# Altium schematic symbol library jlcpcb_2025_04_capacitors_extended_0603.schlib: 3668 symbols (part 16 of 20) (continued)
## GQM1875C2E390JB12D (continued)

## GQM1875C2E470JB12D
designator C?  Capacitance: 47pF  (hidden comment: *)
Capacitor, Ceramic (MLCC), 47pF, ±5%, 250V, null, ±5%, SMD 0603; Manufacturer: Murata Electronics; Manufacturer Part Number: GQM1875C2E470JB12D; Package Size: 0603; JLCPCB Basic Part: No; JLCPCB Part Number: C882552; Supplier 1: LCSC; Category: Capacitors - MLCC; Supplier Part Number 1: C882552; Tolerance: ±5%; Voltage Rating: 250V; Temperature Coefficient: null; RoHS: Yes; ComponentLink1Description: Datasheet; ComponentLink1URL: https://wmsc.lcsc.com/wmsc/upload/file/pdf/v2/lcsc/2201242130_Murata-Electronics-GQM1875C2E470JB12D_C882552.pdf; ComponentLink2Description: JLCPCB Part URL; ComponentLink2URL: https://jlcpcb.com/partdetail/C882552; ComponentLink3Description: LCSC Part URL; ComponentLink3URL: https://lcsc.com/product-detail/Multilayer-Ceramic-Capacitors-MLCC---SMD-SMT_Murata-Electronics-Murata-Electronics-GQM1875C2E470JB12D_C882552.html
footprint CAP-0603 (0603 (1608M) Capacitor)
pins: 1, 2

## GQM1875C2E560JB12D
designator C?  Capacitance: 56pF  (hidden comment: *)
Capacitor, Ceramic (MLCC), 56pF, ±5%, 250V, C0G, ±5%, SMD 0603; Manufacturer: Murata Electronics; Manufacturer Part Number: GQM1875C2E560JB12D; Package Size: 0603; JLCPCB Basic Part: No; JLCPCB Part Number: C237591; Supplier 1: LCSC; Category: Capacitors - MLCC; Supplier Part Number 1: C237591; Tolerance: ±5%; Voltage Rating: 250V; Temperature Coefficient: C0G; RoHS: Yes; ComponentLink1Description: Datasheet; ComponentLink1URL: https://wmsc.lcsc.com/wmsc/upload/file/pdf/v2/lcsc/2109101130_Murata-Electronics-GQM1875C2E560JB12D_C237591.pdf; ComponentLink2Description: JLCPCB Part URL; ComponentLink2URL: https://jlcpcb.com/partdetail/C237591; ComponentLink3Description: LCSC Part URL; ComponentLink3URL: https://lcsc.com/product-detail/Multilayer-Ceramic-Capacitors-MLCC---SMD-SMT_Murata-Electronics-Murata-Electronics-GQM1875C2E560JB12D_C237591.html
footprint CAP-0603 (0603 (1608M) Capacitor)
pins: 1, 2

## GQM1875C2ER50BB12D
designator C?  Capacitance: 0.5pF  (hidden comment: *)
Capacitor, Ceramic (MLCC), 0.5pF, 250V, null, SMD 0603; Manufacturer: Murata Electronics; Manufacturer Part Number: GQM1875C2ER50BB12D; Package Size: 0603; JLCPCB Basic Part: No; JLCPCB Part Number: C2178749; Supplier 1: LCSC; Category: Capacitors - MLCC; Supplier Part Number 1: C2178749; Voltage Rating: 250V; Temperature Coefficient: null; RoHS: Yes; ComponentLink1Description: Datasheet; ComponentLink1URL: https://wmsc.lcsc.com/wmsc/upload/file/pdf/v2/lcsc/2202041000_Murata-Electronics-GQM1875C2ER50BB12D_C2178749.pdf; ComponentLink2Description: JLCPCB Part URL; ComponentLink2URL: https://jlcpcb.com/partdetail/C2178749; ComponentLink3Description: LCSC Part URL; ComponentLink3URL: https://lcsc.com/product-detail/Multilayer-Ceramic-Capacitors-MLCC---SMD-SMT_Murata-Electronics-Murata-Electronics-GQM1875C2ER50BB12D_C2178749.html
footprint CAP-0603 (0603 (1608M) Capacitor)
pins: 1, 2

## GQM1885C1H8R0CB01D
designator C?  Capacitance: 8pF  (hidden comment: *)
Capacitor, Ceramic (MLCC), 8pF, 50V, C0G, SMD 0603; Manufacturer: Murata Electronics; Manufacturer Part Number: GQM1885C1H8R0CB01D; Package Size: 0603; JLCPCB Basic Part: No; JLCPCB Part Number: C415517; Supplier 1: LCSC; Category: Capacitors - MLCC; Supplier Part Number 1: C415517; Voltage Rating: 50V; Temperature Coefficient: C0G; RoHS: Yes; ComponentLink1Description: Datasheet; ComponentLink1URL: https://wmsc.lcsc.com/wmsc/upload/file/pdf/v2/lcsc/2304140030_Murata-Electronics-GQM1885C1H8R0CB01D_C415517.pdf; ComponentLink2Description: JLCPCB Part URL; ComponentLink2URL: https://jlcpcb.com/partdetail/C415517; ComponentLink3Description: LCSC Part URL; ComponentLink3URL: https://lcsc.com/product-detail/Multilayer-Ceramic-Capacitors-MLCC---SMD-SMT_Murata-Electronics-Murata-Electronics-GQM1885C1H8R0CB01D_C415517.html
footprint CAP-0603 (0603 (1608M) Capacitor)
pins: 1, 2

## GRJ188C70J475KE11D
designator C?  Capacitance: 4.7uF  (hidden comment: *)
Capacitor, Ceramic (MLCC), 4.7uF, ±10%, 6.3V, X7S, ±10%, SMD 0603; Manufacturer: Murata Electronics; Manufacturer Part Number: GRJ188C70J475KE11D; Package Size: 0603; JLCPCB Basic Part: No; JLCPCB Part Number: C2177379; Supplier 1: LCSC; Category: Capacitors - MLCC; Supplier Part Number 1: C2177379; Tolerance: ±10%; Voltage Rating: 6.3V; Temperature Coefficient: X7S; RoHS: Yes; ComponentLink1Description: Datasheet; ComponentLink1URL: https://wmsc.lcsc.com/wmsc/upload/file/pdf/v2/lcsc/2308111627_Murata-Electronics-GRJ188C70J475KE11D_C2177379.pdf; ComponentLink2Description: JLCPCB Part URL; ComponentLink2URL: https://jlcpcb.com/partdetail/C2177379; ComponentLink3Description: LCSC Part URL; ComponentLink3URL: https://lcsc.com/product-detail/Multilayer-Ceramic-Capacitors-MLCC---SMD-SMT_Murata-Electronics-Murata-Electronics-GRJ188C70J475KE11D_C2177379.html
footprint CAP-0603 (0603 (1608M) Capacitor)
pins: 1, 2

## GRJ188R72A104KE11D
designator C?  Capacitance: 0.1uF  (hidden comment: *)
Capacitor, Ceramic (MLCC), 0.1uF, ±10%, 100V, X7R, ±10%, SMD 0603; Manufacturer: Murata Electronics; Manufacturer Part Number: GRJ188R72A104KE11D; Package Size: 0603; JLCPCB Basic Part: No; JLCPCB Part Number: C710755; Supplier 1: LCSC; Category: Capacitors - MLCC; Supplier Part Number 1: C710755; Tolerance: ±10%; Voltage Rating: 100V; Temperature Coefficient: X7R; RoHS: Yes; ComponentLink1Description: Datasheet; ComponentLink1URL: https://wmsc.lcsc.com/wmsc/upload/file/pdf/v2/lcsc/2308111627_Murata-Electronics-GRJ188R72A104KE11D_C710755.pdf; ComponentLink2Description: JLCPCB Part URL; ComponentLink2URL: https://jlcpcb.com/partdetail/C710755; ComponentLink3Description: LCSC Part URL; ComponentLink3URL: https://lcsc.com/product-detail/Multilayer-Ceramic-Capacitors-MLCC---SMD-SMT_Murata-Electronics-Murata-Electronics-GRJ188R72A104KE11D_C710755.html
footprint CAP-0603 (0603 (1608M) Capacitor)
pins: 1, 2

## GRM185C81A475KE11D
designator C?  Capacitance: 4.7uF  (hidden comment: *)
Capacitor, Ceramic (MLCC), 4.7uF, ±10%, 10V, X6S, ±10%, SMD 0603; Manufacturer: Murata Electronics; Manufacturer Part Number: GRM185C81A475KE11D; Package Size: 0603; JLCPCB Basic Part: No; JLCPCB Part Number: C2170994; Supplier 1: LCSC; Category: Capacitors - MLCC; Supplier Part Number 1: C2170994; Tolerance: ±10%; Voltage Rating: 10V; Temperature Coefficient: X6S; RoHS: Yes; ComponentLink1Description: Datasheet; ComponentLink1URL: https://wmsc.lcsc.com/wmsc/upload/file/pdf/v2/lcsc/2202040500_Murata-Electronics-GRM185C81A475KE11D_C2170994.pdf; ComponentLink2Description: JLCPCB Part URL; ComponentLink2URL: https://jlcpcb.com/partdetail/C2170994; ComponentLink3Description: LCSC Part URL; ComponentLink3URL: https://lcsc.com/product-detail/Multilayer-Ceramic-Capacitors-MLCC---SMD-SMT_Murata-Electronics-Murata-Electronics-GRM185C81A475KE11D_C2170994.html
footprint CAP-0603 (0603 (1608M) Capacitor)
pins: 1, 2

## GRM185R60G106ME15D
designator C?  Capacitance: 10uF  (hidden comment: *)
Capacitor, Ceramic (MLCC), 10uF, ±20%, 4V, X5R, ±20%, SMD 0603; Manufacturer: Murata Electronics; Manufacturer Part Number: GRM185R60G106ME15D; Package Size: 0603; JLCPCB Basic Part: No; JLCPCB Part Number: C909848; Supplier 1: LCSC; Category: Capacitors - MLCC; Supplier Part Number 1: C909848; Tolerance: ±20%; Voltage Rating: 4V; Temperature Coefficient: X5R; RoHS: Yes; ComponentLink1Description: Datasheet; ComponentLink1URL: https://wmsc.lcsc.com/wmsc/upload/file/pdf/v2/lcsc/2304140030_Murata-Electronics-GRM185R60G106ME15D_C909848.pdf; ComponentLink2Description: JLCPCB Part URL; ComponentLink2URL: https://jlcpcb.com/partdetail/C909848; ComponentLink3Description: LCSC Part URL; ComponentLink3URL: https://lcsc.com/product-detail/Multilayer-Ceramic-Capacitors-MLCC---SMD-SMT_Murata-Electronics-Murata-Electronics-GRM185R60G106ME15D_C909848.html
footprint CAP-0603 (0603 (1608M) Capacitor)
pins: 1, 2

## GRM185R60J225KE26D
designator C?  Capacitance: 2.2uF  (hidden comment: *)
Capacitor, Ceramic (MLCC), 2.2uF, ±10%, 6.3V, X5R, ±10%, SMD 0603; Manufacturer: Murata Electronics; Manufacturer Part Number: GRM185R60J225KE26D; Package Size: 0603; JLCPCB Basic Part: No; JLCPCB Part Number: C440177; Supplier 1: LCSC; Category: Capacitors - MLCC; Supplier Part Number 1: C440177; Tolerance: ±10%; Voltage Rating: 6.3V; Temperature Coefficient: X5R; RoHS: Yes; ComponentLink1Description: Datasheet; ComponentLink1URL: https://wmsc.lcsc.com/wmsc/upload/file/pdf/v2/lcsc/2304140030_Murata-Electronics-GRM185R60J225KE26D_C440177.pdf; ComponentLink2Description: JLCPCB Part URL; ComponentLink2URL: https://jlcpcb.com/partdetail/C440177; ComponentLink3Description: LCSC Part URL; ComponentLink3URL: https://lcsc.com/product-detail/Multilayer-Ceramic-Capacitors-MLCC---SMD-SMT_Murata-Electronics-Murata-Electronics-GRM185R60J225KE26D_C440177.html
footprint CAP-0603 (0603 (1608M) Capacitor)
pins: 1, 2

## GRM185R61A225KE43D
designator C?  Capacitance: 2.2uF  (hidden comment: *)
Capacitor, Ceramic (MLCC), 2.2uF, ±10%, 10V, X5R, ±10%, SMD 0603; Manufacturer: Murata Electronics; Manufacturer Part Number: GRM185R61A225KE43D; Package Size: 0603; JLCPCB Basic Part: No; JLCPCB Part Number: C408133; Supplier 1: LCSC; Category: Capacitors - MLCC; Supplier Part Number 1: C408133; Tolerance: ±10%; Voltage Rating: 10V; Temperature Coefficient: X5R; RoHS: Yes; ComponentLink1Description: Datasheet; ComponentLink1URL: https://wmsc.lcsc.com/wmsc/upload/file/pdf/v2/lcsc/2304140030_Murata-Electronics-GRM185R61A225KE43D_C408133.pdf; ComponentLink2Description: JLCPCB Part URL; ComponentLink2URL: https://jlcpcb.com/partdetail/C408133; ComponentLink3Description: LCSC Part URL; ComponentLink3URL: https://lcsc.com/product-detail/Multilayer-Ceramic-Capacitors-MLCC---SMD-SMT_Murata-Electronics-Murata-Electronics-GRM185R61A225KE43D_C408133.html
footprint CAP-0603 (0603 (1608M) Capacitor)
pins: 1, 2

## GRM185R61C475KE11D
designator C?  Capacitance: 4.7uF  (hidden comment: *)
Capacitor, Ceramic (MLCC), 4.7uF, ±10%, 16V, X5R, ±10%, SMD 0603; Manufacturer: Murata Electronics; Manufacturer Part Number: GRM185R61C475KE11D; Package Size: 0603; JLCPCB Basic Part: No; JLCPCB Part Number: C361060; Supplier 1: LCSC; Category: Capacitors - MLCC; Supplier Part Number 1: C361060; Tolerance: ±10%; Voltage Rating: 16V; Temperature Coefficient: X5R; RoHS: Yes; ComponentLink1Description: Datasheet; ComponentLink1URL: https://wmsc.lcsc.com/wmsc/upload/file/pdf/v2/lcsc/2206171701_Murata-Electronics-GRM185R61C475KE11D_C361060.pdf; ComponentLink2Description: JLCPCB Part URL; ComponentLink2URL: https://jlcpcb.com/partdetail/C361060; ComponentLink3Description: LCSC Part URL; ComponentLink3URL: https://lcsc.com/product-detail/Multilayer-Ceramic-Capacitors-MLCC---SMD-SMT_Murata-Electronics-Murata-Electronics-GRM185R61C475KE11D_C361060.html
footprint CAP-0603 (0603 (1608M) Capacitor)
pins: 1, 2

## GRM186R60J226ME15D
designator C?  Capacitance: 22uF  (hidden comment: *)
Capacitor, Ceramic (MLCC), 22uF, ±20%, 6.3V, X5R, ±20%, SMD 0603; Manufacturer: Murata Electronics; Manufacturer Part Number: GRM186R60J226ME15D; Package Size: 0603; JLCPCB Basic Part: No; JLCPCB Part Number: C237460; Supplier 1: LCSC; Category: Capacitors - MLCC; Supplier Part Number 1: C237460; Tolerance: ±20%; Voltage Rating: 6.3V; Temperature Coefficient: X5R; RoHS: Yes; ComponentLink1Description: Datasheet; ComponentLink1URL: https://wmsc.lcsc.com/wmsc/upload/file/pdf/v2/lcsc/1912111437_Murata-Electronics-GRM186R60J226ME15D_C237460.pdf; ComponentLink2Description: JLCPCB Part URL; ComponentLink2URL: https://jlcpcb.com/partdetail/C237460; ComponentLink3Description: LCSC Part URL; ComponentLink3URL: https://lcsc.com/product-detail/Multilayer-Ceramic-Capacitors-MLCC---SMD-SMT_Murata-Electronics-Murata-Electronics-GRM186R60J226ME15D_C237460.html
footprint CAP-0603 (0603 (1608M) Capacitor)
pins: 1, 2

## GRM187R60J226ME15D
designator C?  Capacitance: 22uF  (hidden comment: *)
Capacitor, Ceramic (MLCC), 22uF, ±20%, 6.3V, X5R, ±20%, SMD 0603; Manufacturer: Murata Electronics; Manufacturer Part Number: GRM187R60J226ME15D; Package Size: 0603; JLCPCB Basic Part: No; JLCPCB Part Number: C710887; Supplier 1: LCSC; Category: Capacitors - MLCC; Supplier Part Number 1: C710887; Tolerance: ±20%; Voltage Rating: 6.3V; Temperature Coefficient: X5R; RoHS: Yes; ComponentLink1Description: Datasheet; ComponentLink1URL: https://wmsc.lcsc.com/wmsc/upload/file/pdf/v2/lcsc/2210190600_Murata-Electronics-GRM187R60J226ME15D_C710887.pdf; ComponentLink2Description: JLCPCB Part URL; ComponentLink2URL: https://jlcpcb.com/partdetail/C710887; ComponentLink3Description: LCSC Part URL; ComponentLink3URL: https://lcsc.com/product-detail/Multilayer-Ceramic-Capacitors-MLCC---SMD-SMT_Murata-Electronics-Murata-Electronics-GRM187R60J226ME15D_C710887.html
footprint CAP-0603 (0603 (1608M) Capacitor)
pins: 1, 2

## GRM187R61A226ME15D
designator C?  Capacitance: 22uF  (hidden comment: *)
Capacitor, Ceramic (MLCC), 22uF, ±20%, 10V, X5R, ±20%, SMD 0603; Manufacturer: Murata Electronics; Manufacturer Part Number: GRM187R61A226ME15D; Package Size: 0603; JLCPCB Basic Part: No; JLCPCB Part Number: C361061; Supplier 1: LCSC; Category: Capacitors - MLCC; Supplier Part Number 1: C361061; Tolerance: ±20%; Voltage Rating: 10V; Temperature Coefficient: X5R; RoHS: Yes; ComponentLink1Description: Datasheet; ComponentLink1URL: https://wmsc.lcsc.com/wmsc/upload/file/pdf/v2/lcsc/2308111554_Murata-Electronics-GRM187R61A226ME15D_C361061.pdf; ComponentLink2Description: JLCPCB Part URL; ComponentLink2URL: https://jlcpcb.com/partdetail/C361061; ComponentLink3Description: LCSC Part URL; ComponentLink3URL: https://lcsc.com/product-detail/Multilayer-Ceramic-Capacitors-MLCC---SMD-SMT_Murata-Electronics-Murata-Electronics-GRM187R61A226ME15D_C361061.html
footprint CAP-0603 (0603 (1608M) Capacitor)
pins: 1, 2

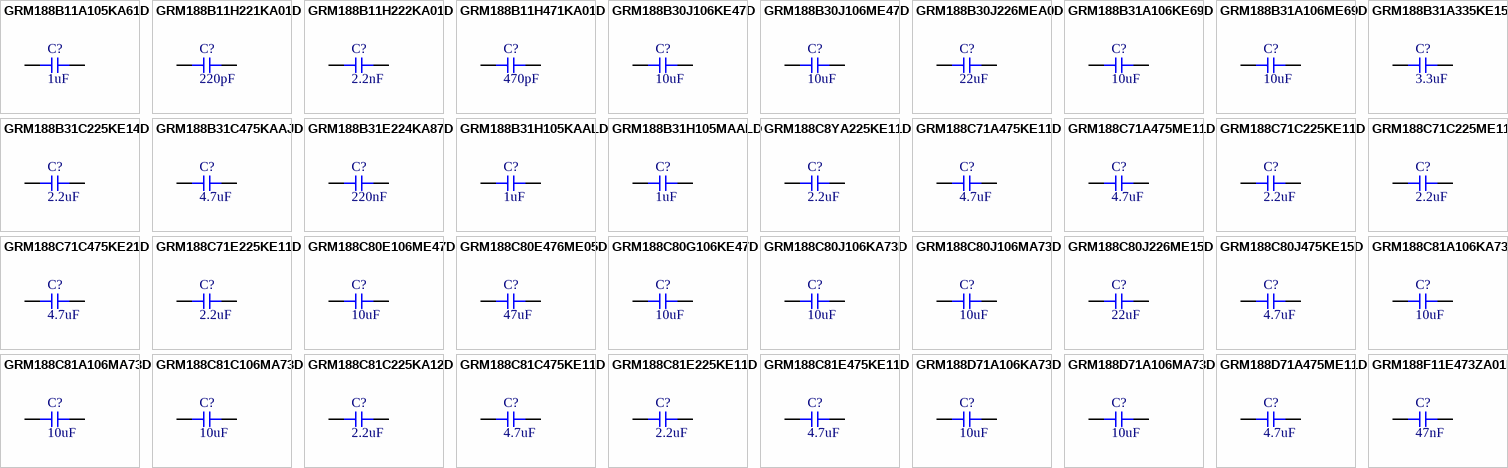
[diagram p72: symbols GRM188B11A105KA61D to GRM188F11E473ZA01D]

## GRM188B11A105KA61D
designator C?  Capacitance: 1uF  (hidden comment: *)
Capacitor, Ceramic (MLCC), 1uF, ±10%, 10V, B, ±10%, SMD 0603; Manufacturer: Murata Electronics; Manufacturer Part Number: GRM188B11A105KA61D; Package Size: 0603; JLCPCB Basic Part: No; JLCPCB Part Number: C162264; Supplier 1: LCSC; Category: Capacitors - MLCC; Supplier Part Number 1: C162264; Tolerance: ±10%; Voltage Rating: 10V; Temperature Coefficient: B; RoHS: Yes; ComponentLink1Description: Datasheet; ComponentLink1URL: https://wmsc.lcsc.com/wmsc/upload/file/pdf/v2/lcsc/1912111437_Murata-Electronics-GRM188B11A105KA61D_C162264.pdf; ComponentLink2Description: JLCPCB Part URL; ComponentLink2URL: https://jlcpcb.com/partdetail/C162264; ComponentLink3Description: LCSC Part URL; ComponentLink3URL: https://lcsc.com/product-detail/Multilayer-Ceramic-Capacitors-MLCC---SMD-SMT_Murata-Electronics-Murata-Electronics-GRM188B11A105KA61D_C162264.html
footprint CAP-0603 (0603 (1608M) Capacitor)
pins: 1, 2

## GRM188B11H221KA01D
designator C?  Capacitance: 220pF  (hidden comment: *)
Capacitor, Ceramic (MLCC), 220pF, ±10%, ±10%, SMD 0603; Manufacturer: Murata Electronics; Manufacturer Part Number: GRM188B11H221KA01D; Package Size: 0603; JLCPCB Basic Part: No; JLCPCB Part Number: C783269; Supplier 1: LCSC; Category: Capacitors - MLCC; Supplier Part Number 1: C783269; Tolerance: ±10%; RoHS: Yes; ComponentLink1Description: Datasheet; ComponentLink1URL: https://wmsc.lcsc.com/wmsc/upload/file/pdf/v2/lcsc/2304140030_Murata-Electronics-GRM188B11H221KA01D_C783269.pdf; ComponentLink2Description: JLCPCB Part URL; ComponentLink2URL: https://jlcpcb.com/partdetail/C783269; ComponentLink3Description: LCSC Part URL; ComponentLink3URL: https://lcsc.com/product-detail/Multilayer-Ceramic-Capacitors-MLCC---SMD-SMT_Murata-Electronics-Murata-Electronics-GRM188B11H221KA01D_C783269.html
footprint CAP-0603 (0603 (1608M) Capacitor)
pins: 1, 2

## GRM188B11H222KA01D
designator C?  Capacitance: 2.2nF  (hidden comment: *)
Capacitor, Ceramic (MLCC), 2.2nF, ±10%, 50V, C0G, ±10%, SMD 0603; Manufacturer: Murata Electronics; Manufacturer Part Number: GRM188B11H222KA01D; Package Size: 0603; JLCPCB Basic Part: No; JLCPCB Part Number: C415545; Supplier 1: LCSC; Category: Capacitors - MLCC; Supplier Part Number 1: C415545; Tolerance: ±10%; Voltage Rating: 50V; Temperature Coefficient: C0G; RoHS: Yes; ComponentLink1Description: Datasheet; ComponentLink1URL: https://wmsc.lcsc.com/wmsc/upload/file/pdf/v2/lcsc/2304140030_Murata-Electronics-GRM188B11H222KA01D_C415545.pdf; ComponentLink2Description: JLCPCB Part URL; ComponentLink2URL: https://jlcpcb.com/partdetail/C415545; ComponentLink3Description: LCSC Part URL; ComponentLink3URL: https://lcsc.com/product-detail/Multilayer-Ceramic-Capacitors-MLCC---SMD-SMT_Murata-Electronics-Murata-Electronics-GRM188B11H222KA01D_C415545.html
footprint CAP-0603 (0603 (1608M) Capacitor)
pins: 1, 2

## GRM188B11H471KA01D
designator C?  Capacitance: 470pF  (hidden comment: *)
Capacitor, Ceramic (MLCC), 470pF, ±10%, 50V, B, ±10%, SMD 0603; Manufacturer: Murata Electronics; Manufacturer Part Number: GRM188B11H471KA01D; Package Size: 0603; JLCPCB Basic Part: No; JLCPCB Part Number: C521248; Supplier 1: LCSC; Category: Capacitors - MLCC; Supplier Part Number 1: C521248; Tolerance: ±10%; Voltage Rating: 50V; Temperature Coefficient: B; RoHS: Yes; ComponentLink1Description: Datasheet; ComponentLink1URL: https://wmsc.lcsc.com/wmsc/upload/file/pdf/v2/lcsc/2005071506_Murata-Electronics-GRM188B11H471KA01D_C521248.pdf; ComponentLink2Description: JLCPCB Part URL; ComponentLink2URL: https://jlcpcb.com/partdetail/C521248; ComponentLink3Description: LCSC Part URL; ComponentLink3URL: https://lcsc.com/product-detail/Multilayer-Ceramic-Capacitors-MLCC---SMD-SMT_Murata-Electronics-Murata-Electronics-GRM188B11H471KA01D_C521248.html
footprint CAP-0603 (0603 (1608M) Capacitor)
pins: 1, 2

## GRM188B30J106KE47D
designator C?  Capacitance: 10uF  (hidden comment: *)
Capacitor, Ceramic (MLCC), 10uF, ±10%, 6.3V, B, ±10%, SMD 0603; Manufacturer: Murata Electronics; Manufacturer Part Number: GRM188B30J106KE47D; Package Size: 0603; JLCPCB Basic Part: No; JLCPCB Part Number: C393030; Supplier 1: LCSC; Category: Capacitors - MLCC; Supplier Part Number 1: C393030; Tolerance: ±10%; Voltage Rating: 6.3V; Temperature Coefficient: B; RoHS: Yes; ComponentLink1Description: Datasheet; ComponentLink1URL: https://wmsc.lcsc.com/wmsc/upload/file/pdf/v2/lcsc/1912111437_Murata-Electronics-GRM188B30J106KE47D_C393030.pdf; ComponentLink2Description: JLCPCB Part URL; ComponentLink2URL: https://jlcpcb.com/partdetail/C393030; ComponentLink3Description: LCSC Part URL; ComponentLink3URL: https://lcsc.com/product-detail/Multilayer-Ceramic-Capacitors-MLCC---SMD-SMT_Murata-Electronics-Murata-Electronics-GRM188B30J106KE47D_C393030.html
footprint CAP-0603 (0603 (1608M) Capacitor)
pins: 1, 2

## GRM188B30J106ME47D
designator C?  Capacitance: 10uF  (hidden comment: *)
Capacitor, Ceramic (MLCC), 10uF, ±20%, 6.3V, B, ±20%, SMD 0603; Manufacturer: Murata Electronics; Manufacturer Part Number: GRM188B30J106ME47D; Package Size: 0603; JLCPCB Basic Part: No; JLCPCB Part Number: C15499; Supplier 1: LCSC; Category: Capacitors - MLCC; Supplier Part Number 1: C15499; Tolerance: ±20%; Voltage Rating: 6.3V; Temperature Coefficient: B; RoHS: Yes; ComponentLink1Description: Datasheet; ComponentLink1URL: https://wmsc.lcsc.com/wmsc/upload/file/pdf/v2/lcsc/1810311111_Murata-Electronics-GRM188B30J106ME47D_C15499.pdf; ComponentLink2Description: JLCPCB Part URL; ComponentLink2URL: https://jlcpcb.com/partdetail/C15499; ComponentLink3Description: LCSC Part URL; ComponentLink3URL: https://lcsc.com/product-detail/Multilayer-Ceramic-Capacitors-MLCC---SMD-SMT_Murata-Electronics-Murata-Electronics-GRM188B30J106ME47D_C15499.html
footprint CAP-0603 (0603 (1608M) Capacitor)
pins: 1, 2

## GRM188B30J226MEA0D
designator C?  Capacitance: 22uF  (hidden comment: *)
Capacitor, Ceramic (MLCC), 22uF, ±20%, 6.3V, B, ±20%, SMD 0603; Manufacturer: Murata Electronics; Manufacturer Part Number: GRM188B30J226MEA0D; Package Size: 0603; JLCPCB Basic Part: No; JLCPCB Part Number: C15500; Supplier 1: LCSC; Category: Capacitors - MLCC; Supplier Part Number 1: C15500; Tolerance: ±20%; Voltage Rating: 6.3V; Temperature Coefficient: B; RoHS: Yes; ComponentLink1Description: Datasheet; ComponentLink1URL: https://wmsc.lcsc.com/wmsc/upload/file/pdf/v2/lcsc/1810311110_Murata-Electronics-GRM188B30J226MEA0D_C15500.pdf; ComponentLink2Description: JLCPCB Part URL; ComponentLink2URL: https://jlcpcb.com/partdetail/C15500; ComponentLink3Description: LCSC Part URL; ComponentLink3URL: https://lcsc.com/product-detail/Multilayer-Ceramic-Capacitors-MLCC---SMD-SMT_Murata-Electronics-Murata-Electronics-GRM188B30J226MEA0D_C15500.html
footprint CAP-0603 (0603 (1608M) Capacitor)
pins: 1, 2

## GRM188B31A106KE69D
designator C?  Capacitance: 10uF  (hidden comment: *)
Capacitor, Ceramic (MLCC), 10uF, ±10%, 10V, B, ±10%, SMD 0603; Manufacturer: Murata Electronics; Manufacturer Part Number: GRM188B31A106KE69D; Package Size: 0603; JLCPCB Basic Part: No; JLCPCB Part Number: C469532; Supplier 1: LCSC; Category: Capacitors - MLCC; Supplier Part Number 1: C469532; Tolerance: ±10%; Voltage Rating: 10V; Temperature Coefficient: B; RoHS: Yes; ComponentLink1Description: Datasheet; ComponentLink1URL: https://wmsc.lcsc.com/wmsc/upload/file/pdf/v2/lcsc/2001091507_Murata-Electronics-GRM188B31A106KE69D_C469532.pdf; ComponentLink2Description: JLCPCB Part URL; ComponentLink2URL: https://jlcpcb.com/partdetail/C469532; ComponentLink3Description: LCSC Part URL; ComponentLink3URL: https://lcsc.com/product-detail/Multilayer-Ceramic-Capacitors-MLCC---SMD-SMT_Murata-Electronics-Murata-Electronics-GRM188B31A106KE69D_C469532.html
footprint CAP-0603 (0603 (1608M) Capacitor)
pins: 1, 2

## GRM188B31A106ME69D
designator C?  Capacitance: 10uF  (hidden comment: *)
Capacitor, Ceramic (MLCC), 10uF, ±20%, 10V, B, ±20%, SMD 0603; Manufacturer: Murata Electronics; Manufacturer Part Number: GRM188B31A106ME69D; Package Size: 0603; JLCPCB Basic Part: No; JLCPCB Part Number: C162265; Supplier 1: LCSC; Category: Capacitors - MLCC; Supplier Part Number 1: C162265; Tolerance: ±20%; Voltage Rating: 10V; Temperature Coefficient: B; RoHS: Yes; ComponentLink1Description: Datasheet; ComponentLink1URL: https://wmsc.lcsc.com/wmsc/upload/file/pdf/v2/lcsc/1810311134_Murata-Electronics-GRM188B31A106ME69D_C162265.pdf; ComponentLink2Description: JLCPCB Part URL; ComponentLink2URL: https://jlcpcb.com/partdetail/C162265; ComponentLink3Description: LCSC Part URL; ComponentLink3URL: https://lcsc.com/product-detail/Multilayer-Ceramic-Capacitors-MLCC---SMD-SMT_Murata-Electronics-Murata-Electronics-GRM188B31A106ME69D_C162265.html
footprint CAP-0603 (0603 (1608M) Capacitor)
pins: 1, 2

## GRM188B31A335KE15D
designator C?  Capacitance: 3.3uF  (hidden comment: *)
Capacitor, Ceramic (MLCC), 3.3uF, ±10%, 10V, B, ±10%, SMD 0603; Manufacturer: Murata Electronics; Manufacturer Part Number: GRM188B31A335KE15D; Package Size: 0603; JLCPCB Basic Part: No; JLCPCB Part Number: C528975; Supplier 1: LCSC; Category: Capacitors - MLCC; Supplier Part Number 1: C528975; Tolerance: ±10%; Voltage Rating: 10V; Temperature Coefficient: B; RoHS: Yes; ComponentLink1Description: Datasheet; ComponentLink1URL: https://wmsc.lcsc.com/wmsc/upload/file/pdf/v2/lcsc/2005141808_Murata-Electronics-GRM188B31A335KE15D_C528975.pdf; ComponentLink2Description: JLCPCB Part URL; ComponentLink2URL: https://jlcpcb.com/partdetail/C528975; ComponentLink3Description: LCSC Part URL; ComponentLink3URL: https://lcsc.com/product-detail/Multilayer-Ceramic-Capacitors-MLCC---SMD-SMT_Murata-Electronics-Murata-Electronics-GRM188B31A335KE15D_C528975.html
footprint CAP-0603 (0603 (1608M) Capacitor)
pins: 1, 2

## GRM188B31C225KE14D
designator C?  Capacitance: 2.2uF  (hidden comment: *)
Capacitor, Ceramic (MLCC), 2.2uF, ±10%, ±10%, SMD 0603; Manufacturer: Murata Electronics; Manufacturer Part Number: GRM188B31C225KE14D; Package Size: 0603; JLCPCB Basic Part: No; JLCPCB Part Number: C913643; Supplier 1: LCSC; Category: Capacitors - MLCC; Supplier Part Number 1: C913643; Tolerance: ±10%; RoHS: Yes; ComponentLink1Description: Datasheet; ComponentLink1URL: https://wmsc.lcsc.com/wmsc/upload/file/pdf/v2/lcsc/2201131300_Murata-Electronics-GRM188B31C225KE14D_C913643.pdf; ComponentLink2Description: JLCPCB Part URL; ComponentLink2URL: https://jlcpcb.com/partdetail/C913643; ComponentLink3Description: LCSC Part URL; ComponentLink3URL: https://lcsc.com/product-detail/Multilayer-Ceramic-Capacitors-MLCC---SMD-SMT_Murata-Electronics-Murata-Electronics-GRM188B31C225KE14D_C913643.html
footprint CAP-0603 (0603 (1608M) Capacitor)
pins: 1, 2

## GRM188B31C475KAAJD
designator C?  Capacitance: 4.7uF  (hidden comment: *)
Capacitor, Ceramic (MLCC), 4.7uF, ±10%, 16V, B, ±10%, SMD 0603; Manufacturer: Murata Electronics; Manufacturer Part Number: GRM188B31C475KAAJD; Package Size: 0603; JLCPCB Basic Part: No; JLCPCB Part Number: C162266; Supplier 1: LCSC; Category: Capacitors - MLCC; Supplier Part Number 1: C162266; Tolerance: ±10%; Voltage Rating: 16V; Temperature Coefficient: B; RoHS: Yes; ComponentLink1Description: Datasheet; ComponentLink1URL: https://wmsc.lcsc.com/wmsc/upload/file/pdf/v2/lcsc/2304140030_Murata-Electronics-GRM188B31C475KAAJD_C162266.pdf; ComponentLink2Description: JLCPCB Part URL; ComponentLink2URL: https://jlcpcb.com/partdetail/C162266; ComponentLink3Description: LCSC Part URL; ComponentLink3URL: https://lcsc.com/product-detail/Multilayer-Ceramic-Capacitors-MLCC---SMD-SMT_Murata-Electronics-Murata-Electronics-GRM188B31C475KAAJD_C162266.html
footprint CAP-0603 (0603 (1608M) Capacitor)
pins: 1, 2

## GRM188B31E224KA87D
designator C?  Capacitance: 220nF  (hidden comment: *)
Capacitor, Ceramic (MLCC), 220nF, ±10%, 25V, B, ±10%, SMD 0603; Manufacturer: Murata Electronics; Manufacturer Part Number: GRM188B31E224KA87D; Package Size: 0603; JLCPCB Basic Part: No; JLCPCB Part Number: C464419; Supplier 1: LCSC; Category: Capacitors - MLCC; Supplier Part Number 1: C464419; Tolerance: ±10%; Voltage Rating: 25V; Temperature Coefficient: B; RoHS: Yes; ComponentLink1Description: Datasheet; ComponentLink1URL: https://wmsc.lcsc.com/wmsc/upload/file/pdf/v2/lcsc/2304140030_Murata-Electronics-GRM188B31E224KA87D_C464419.pdf; ComponentLink2Description: JLCPCB Part URL; ComponentLink2URL: https://jlcpcb.com/partdetail/C464419; ComponentLink3Description: LCSC Part URL; ComponentLink3URL: https://lcsc.com/product-detail/Multilayer-Ceramic-Capacitors-MLCC---SMD-SMT_Murata-Electronics-Murata-Electronics-GRM188B31E224KA87D_C464419.html
footprint CAP-0603 (0603 (1608M) Capacitor)
pins: 1, 2

## GRM188B31H105KAALD
designator C?  Capacitance: 1uF  (hidden comment: *)
Capacitor, Ceramic (MLCC), 1uF, ±10%, ±10%, SMD 0603; Manufacturer: Murata Electronics; Manufacturer Part Number: GRM188B31H105KAALD; Package Size: 0603; JLCPCB Basic Part: No; JLCPCB Part Number: C913562; Supplier 1: LCSC; Category: Capacitors - MLCC; Supplier Part Number 1: C913562; Tolerance: ±10%; RoHS: Yes; ComponentLink1Description: Datasheet; ComponentLink1URL: https://wmsc.lcsc.com/wmsc/upload/file/pdf/v2/lcsc/2201131300_Murata-Electronics-GRM188B31H105KAALD_C913562.pdf; ComponentLink2Description: JLCPCB Part URL; ComponentLink2URL: https://jlcpcb.com/partdetail/C913562; ComponentLink3Description: LCSC Part URL; ComponentLink3URL: https://lcsc.com/product-detail/Multilayer-Ceramic-Capacitors-MLCC---SMD-SMT_Murata-Electronics-Murata-Electronics-GRM188B31H105KAALD_C913562.html
footprint CAP-0603 (0603 (1608M) Capacitor)
pins: 1, 2

## GRM188B31H105MAALD
designator C?  Capacitance: 1uF  (hidden comment: *)
Capacitor, Ceramic (MLCC), 1uF, ±20%, 50V, B, ±20%, SMD 0603; Manufacturer: Murata Electronics; Manufacturer Part Number: GRM188B31H105MAALD; Package Size: 0603; JLCPCB Basic Part: No; JLCPCB Part Number: C363951; Supplier 1: LCSC; Category: Capacitors - MLCC; Supplier Part Number 1: C363951; Tolerance: ±20%; Voltage Rating: 50V; Temperature Coefficient: B; RoHS: Yes; ComponentLink1Description: Datasheet; ComponentLink1URL: https://wmsc.lcsc.com/wmsc/upload/file/pdf/v2/lcsc/1912111437_Murata-Electronics-GRM188B31H105MAALD_C363951.pdf; ComponentLink2Description: JLCPCB Part URL; ComponentLink2URL: https://jlcpcb.com/partdetail/C363951; ComponentLink3Description: LCSC Part URL; ComponentLink3URL: https://lcsc.com/product-detail/Multilayer-Ceramic-Capacitors-MLCC---SMD-SMT_Murata-Electronics-Murata-Electronics-GRM188B31H105MAALD_C363951.html
footprint CAP-0603 (0603 (1608M) Capacitor)
pins: 1, 2

## GRM188C8YA225KE11D
designator C?  Capacitance: 2.2uF  (hidden comment: *)
Capacitor, Ceramic (MLCC), 2.2uF, ±10%, 35V, X6S, ±10%, SMD 0603; Manufacturer: Murata Electronics; Manufacturer Part Number: GRM188C8YA225KE11D; Package Size: 0603; JLCPCB Basic Part: No; JLCPCB Part Number: C408135; Supplier 1: LCSC; Category: Capacitors - MLCC; Supplier Part Number 1: C408135; Tolerance: ±10%; Voltage Rating: 35V; Temperature Coefficient: X6S; RoHS: Yes; ComponentLink1Description: Datasheet; ComponentLink1URL: https://wmsc.lcsc.com/wmsc/upload/file/pdf/v2/lcsc/2304140030_Murata-Electronics-GRM188C8YA225KE11D_C408135.pdf; ComponentLink2Description: JLCPCB Part URL; ComponentLink2URL: https://jlcpcb.com/partdetail/C408135; ComponentLink3Description: LCSC Part URL; ComponentLink3URL: https://lcsc.com/product-detail/Multilayer-Ceramic-Capacitors-MLCC---SMD-SMT_Murata-Electronics-Murata-Electronics-GRM188C8YA225KE11D_C408135.html
footprint CAP-0603 (0603 (1608M) Capacitor)
pins: 1, 2

## GRM188C71A475KE11D
designator C?  Capacitance: 4.7uF  (hidden comment: *)
Capacitor, Ceramic (MLCC), 4.7uF, ±10%, 10V, X7S, ±10%, SMD 0603; Manufacturer: Murata Electronics; Manufacturer Part Number: GRM188C71A475KE11D; Package Size: 0603; JLCPCB Basic Part: No; JLCPCB Part Number: C385034; Supplier 1: LCSC; Category: Capacitors - MLCC; Supplier Part Number 1: C385034; Tolerance: ±10%; Voltage Rating: 10V; Temperature Coefficient: X7S; RoHS: Yes; ComponentLink1Description: Datasheet; ComponentLink1URL: https://wmsc.lcsc.com/wmsc/upload/file/pdf/v2/lcsc/1912111437_Murata-Electronics-GRM188C71A475KE11D_C385034.pdf; ComponentLink2Description: JLCPCB Part URL; ComponentLink2URL: https://jlcpcb.com/partdetail/C385034; ComponentLink3Description: LCSC Part URL; ComponentLink3URL: https://lcsc.com/product-detail/Multilayer-Ceramic-Capacitors-MLCC---SMD-SMT_Murata-Electronics-Murata-Electronics-GRM188C71A475KE11D_C385034.html
footprint CAP-0603 (0603 (1608M) Capacitor)
pins: 1, 2

## GRM188C71A475ME11D
designator C?  Capacitance: 4.7uF  (hidden comment: *)
Capacitor, Ceramic (MLCC), 4.7uF, ±20%, 10V, X7S, ±20%, SMD 0603; Manufacturer: Murata Electronics; Manufacturer Part Number: GRM188C71A475ME11D; Package Size: 0603; JLCPCB Basic Part: No; JLCPCB Part Number: C710915; Supplier 1: LCSC; Category: Capacitors - MLCC; Supplier Part Number 1: C710915; Tolerance: ±20%; Voltage Rating: 10V; Temperature Coefficient: X7S; RoHS: Yes; ComponentLink1Description: Datasheet; ComponentLink1URL: https://wmsc.lcsc.com/wmsc/upload/file/pdf/v2/lcsc/2308111612_Murata-Electronics-GRM188C71A475ME11D_C710915.pdf; ComponentLink2Description: JLCPCB Part URL; ComponentLink2URL: https://jlcpcb.com/partdetail/C710915; ComponentLink3Description: LCSC Part URL; ComponentLink3URL: https://lcsc.com/product-detail/Multilayer-Ceramic-Capacitors-MLCC---SMD-SMT_Murata-Electronics-Murata-Electronics-GRM188C71A475ME11D_C710915.html
footprint CAP-0603 (0603 (1608M) Capacitor)
pins: 1, 2

## GRM188C71C225KE11D
designator C?  Capacitance: 2.2uF  (hidden comment: *)
Capacitor, Ceramic (MLCC), 2.2uF, ±10%, 16V, X7S, ±10%, SMD 0603; Manufacturer: Murata Electronics; Manufacturer Part Number: GRM188C71C225KE11D; Package Size: 0603; JLCPCB Basic Part: No; JLCPCB Part Number: C237436; Supplier 1: LCSC; Category: Capacitors - MLCC; Supplier Part Number 1: C237436; Tolerance: ±10%; Voltage Rating: 16V; Temperature Coefficient: X7S; RoHS: Yes; ComponentLink1Description: Datasheet; ComponentLink1URL: https://wmsc.lcsc.com/wmsc/upload/file/pdf/v2/lcsc/1912111437_Murata-Electronics-GRM188C71C225KE11D_C237436.pdf; ComponentLink2Description: JLCPCB Part URL; ComponentLink2URL: https://jlcpcb.com/partdetail/C237436; ComponentLink3Description: LCSC Part URL; ComponentLink3URL: https://lcsc.com/product-detail/Multilayer-Ceramic-Capacitors-MLCC---SMD-SMT_Murata-Electronics-Murata-Electronics-GRM188C71C225KE11D_C237436.html
footprint CAP-0603 (0603 (1608M) Capacitor)
pins: 1, 2

## GRM188C71C225ME11D
designator C?  Capacitance: 2.2uF  (hidden comment: *)
Capacitor, Ceramic (MLCC), 2.2uF, ±20%, 16V, X7S, ±20%, SMD 0603; Manufacturer: Murata Electronics; Manufacturer Part Number: GRM188C71C225ME11D; Package Size: 0603; JLCPCB Basic Part: No; JLCPCB Part Number: C2219201; Supplier 1: LCSC; Category: Capacitors - MLCC; Supplier Part Number 1: C2219201; Tolerance: ±20%; Voltage Rating: 16V; Temperature Coefficient: X7S; RoHS: Yes; ComponentLink1Description: Datasheet; ComponentLink1URL: https://wmsc.lcsc.com/wmsc/upload/file/pdf/v2/lcsc/2104170112_Murata-Electronics-GRM188C71C225ME11D_C2219201.pdf; ComponentLink2Description: JLCPCB Part URL; ComponentLink2URL: https://jlcpcb.com/partdetail/C2219201; ComponentLink3Description: LCSC Part URL; ComponentLink3URL: https://lcsc.com/product-detail/Multilayer-Ceramic-Capacitors-MLCC---SMD-SMT_Murata-Electronics-Murata-Electronics-GRM188C71C225ME11D_C2219201.html
footprint CAP-0603 (0603 (1608M) Capacitor)
pins: 1, 2

## GRM188C71C475KE21D
designator C?  Capacitance: 4.7uF  (hidden comment: *)
Capacitor, Ceramic (MLCC), 4.7uF, ±10%, 16V, X7S, ±10%, SMD 0603; Manufacturer: Murata Electronics; Manufacturer Part Number: GRM188C71C475KE21D; Package Size: 0603; JLCPCB Basic Part: No; JLCPCB Part Number: C237615; Supplier 1: LCSC; Category: Capacitors - MLCC; Supplier Part Number 1: C237615; Tolerance: ±10%; Voltage Rating: 16V; Temperature Coefficient: X7S; RoHS: Yes; ComponentLink1Description: Datasheet; ComponentLink1URL: https://wmsc.lcsc.com/wmsc/upload/file/pdf/v2/lcsc/2304140030_Murata-Electronics-GRM188C71C475KE21D_C237615.pdf; ComponentLink2Description: JLCPCB Part URL; ComponentLink2URL: https://jlcpcb.com/partdetail/C237615; ComponentLink3Description: LCSC Part URL; ComponentLink3URL: https://lcsc.com/product-detail/Multilayer-Ceramic-Capacitors-MLCC---SMD-SMT_Murata-Electronics-Murata-Electronics-GRM188C71C475KE21D_C237615.html
footprint CAP-0603 (0603 (1608M) Capacitor)
pins: 1, 2

## GRM188C71E225KE11D
designator C?  Capacitance: 2.2uF  (hidden comment: *)
Capacitor, Ceramic (MLCC), 2.2uF, ±10%, 25V, X7S, ±10%, SMD 0603; Manufacturer: Murata Electronics; Manufacturer Part Number: GRM188C71E225KE11D; Package Size: 0603; JLCPCB Basic Part: No; JLCPCB Part Number: C162267; Supplier 1: LCSC; Category: Capacitors - MLCC; Supplier Part Number 1: C162267; Tolerance: ±10%; Voltage Rating: 25V; Temperature Coefficient: X7S; RoHS: Yes; ComponentLink1Description: Datasheet; ComponentLink1URL: https://wmsc.lcsc.com/wmsc/upload/file/pdf/v2/lcsc/2304140030_Murata-Electronics-GRM188C71E225KE11D_C162267.pdf; ComponentLink2Description: JLCPCB Part URL; ComponentLink2URL: https://jlcpcb.com/partdetail/C162267; ComponentLink3Description: LCSC Part URL; ComponentLink3URL: https://lcsc.com/product-detail/Multilayer-Ceramic-Capacitors-MLCC---SMD-SMT_Murata-Electronics-Murata-Electronics-GRM188C71E225KE11D_C162267.html
footprint CAP-0603 (0603 (1608M) Capacitor)
pins: 1, 2

## GRM188C80E106ME47D
designator C?  Capacitance: 10uF  (hidden comment: *)
Capacitor, Ceramic (MLCC), 10uF, ±20%, 2.5V, X6S, ±20%, SMD 0603; Manufacturer: Murata Electronics; Manufacturer Part Number: GRM188C80E106ME47D; Package Size: 0603; JLCPCB Basic Part: No; JLCPCB Part Number: C184773; Supplier 1: LCSC; Category: Capacitors - MLCC; Supplier Part Number 1: C184773; Tolerance: ±20%; Voltage Rating: 2.5V; Temperature Coefficient: X6S; RoHS: Yes; ComponentLink1Description: Datasheet; ComponentLink1URL: https://wmsc.lcsc.com/wmsc/upload/file/pdf/v2/lcsc/1810311135_Murata-Electronics-GRM188C80E106ME47D_C184773.pdf; ComponentLink2Description: JLCPCB Part URL; ComponentLink2URL: https://jlcpcb.com/partdetail/C184773; ComponentLink3Description: LCSC Part URL; ComponentLink3URL: https://lcsc.com/product-detail/Multilayer-Ceramic-Capacitors-MLCC---SMD-SMT_Murata-Electronics-Murata-Electronics-GRM188C80E106ME47D_C184773.html
footprint CAP-0603 (0603 (1608M) Capacitor)
pins: 1, 2

## GRM188C80E476ME05D
designator C?  Capacitance: 47uF  (hidden comment: *)
Capacitor, Ceramic (MLCC), 47uF, ±20%, 2.5V, X6S, ±20%, SMD 0603; Manufacturer: Murata Electronics; Manufacturer Part Number: GRM188C80E476ME05D; Package Size: 0603; JLCPCB Basic Part: No; JLCPCB Part Number: C576468; Supplier 1: LCSC; Category: Capacitors - MLCC; Supplier Part Number 1: C576468; Tolerance: ±20%; Voltage Rating: 2.5V; Temperature Coefficient: X6S; RoHS: Yes; ComponentLink1Description: Datasheet; ComponentLink1URL: https://wmsc.lcsc.com/wmsc/upload/file/pdf/v2/lcsc/2103161033_Murata-Electronics-GRM188C80E476ME05D_C576468.pdf; ComponentLink2Description: JLCPCB Part URL; ComponentLink2URL: https://jlcpcb.com/partdetail/C576468; ComponentLink3Description: LCSC Part URL; ComponentLink3URL: https://lcsc.com/product-detail/Multilayer-Ceramic-Capacitors-MLCC---SMD-SMT_Murata-Electronics-Murata-Electronics-GRM188C80E476ME05D_C576468.html
footprint CAP-0603 (0603 (1608M) Capacitor)
pins: 1, 2

## GRM188C80G106KE47D
designator C?  Capacitance: 10uF  (hidden comment: *)
Capacitor, Ceramic (MLCC), 10uF, ±10%, 4V, X6S, ±10%, SMD 0603; Manufacturer: Murata Electronics; Manufacturer Part Number: GRM188C80G106KE47D; Package Size: 0603; JLCPCB Basic Part: No; JLCPCB Part Number: C710916; Supplier 1: LCSC; Category: Capacitors - MLCC; Supplier Part Number 1: C710916; Tolerance: ±10%; Voltage Rating: 4V; Temperature Coefficient: X6S; RoHS: Yes; ComponentLink1Description: Datasheet; ComponentLink1URL: https://wmsc.lcsc.com/wmsc/upload/file/pdf/v2/lcsc/2102051203_Murata-Electronics-GRM188C80G106KE47D_C710916.pdf; ComponentLink2Description: JLCPCB Part URL; ComponentLink2URL: https://jlcpcb.com/partdetail/C710916; ComponentLink3Description: LCSC Part URL; ComponentLink3URL: https://lcsc.com/product-detail/Multilayer-Ceramic-Capacitors-MLCC---SMD-SMT_Murata-Electronics-Murata-Electronics-GRM188C80G106KE47D_C710916.html
footprint CAP-0603 (0603 (1608M) Capacitor)
pins: 1, 2

## GRM188C80J106KA73D
designator C?  Capacitance: 10uF  (hidden comment: *)
Capacitor, Ceramic (MLCC), 10uF, ±10%, ±10%, SMD 0603; Manufacturer: Murata Electronics; Manufacturer Part Number: GRM188C80J106KA73D; Package Size: 0603; JLCPCB Basic Part: No; JLCPCB Part Number: C385035; Supplier 1: LCSC; Category: Capacitors - MLCC; Supplier Part Number 1: C385035; Tolerance: ±10%; RoHS: Yes; ComponentLink1Description: Datasheet; ComponentLink1URL: https://wmsc.lcsc.com/wmsc/upload/file/pdf/v2/lcsc/2104301133_Murata-Electronics-GRM188C80J106KA73D_C385035.pdf; ComponentLink2Description: JLCPCB Part URL; ComponentLink2URL: https://jlcpcb.com/partdetail/C385035; ComponentLink3Description: LCSC Part URL; ComponentLink3URL: https://lcsc.com/product-detail/Multilayer-Ceramic-Capacitors-MLCC---SMD-SMT_Murata-Electronics-Murata-Electronics-GRM188C80J106KA73D_C385035.html
footprint CAP-0603 (0603 (1608M) Capacitor)
pins: 1, 2

## GRM188C80J106MA73D
designator C?  Capacitance: 10uF  (hidden comment: *)
Capacitor, Ceramic (MLCC), 10uF, ±20%, 6.3V, X6S, ±20%, SMD 0603; Manufacturer: Murata Electronics; Manufacturer Part Number: GRM188C80J106MA73D; Package Size: 0603; JLCPCB Basic Part: No; JLCPCB Part Number: C469533; Supplier 1: LCSC; Category: Capacitors - MLCC; Supplier Part Number 1: C469533; Tolerance: ±20%; Voltage Rating: 6.3V; Temperature Coefficient: X6S; RoHS: Yes; ComponentLink1Description: Datasheet; ComponentLink1URL: https://wmsc.lcsc.com/wmsc/upload/file/pdf/v2/lcsc/1912241611_Murata-Electronics-GRM188C80J106MA73D_C469533.pdf; ComponentLink2Description: JLCPCB Part URL; ComponentLink2URL: https://jlcpcb.com/partdetail/C469533; ComponentLink3Description: LCSC Part URL; ComponentLink3URL: https://lcsc.com/product-detail/Multilayer-Ceramic-Capacitors-MLCC---SMD-SMT_Murata-Electronics-Murata-Electronics-GRM188C80J106MA73D_C469533.html
footprint CAP-0603 (0603 (1608M) Capacitor)
pins: 1, 2

## GRM188C80J226ME15D
designator C?  Capacitance: 22uF  (hidden comment: *)
Capacitor, Ceramic (MLCC), 22uF, ±20%, 6.3V, X6S, ±20%, SMD 0603; Manufacturer: Murata Electronics; Manufacturer Part Number: GRM188C80J226ME15D; Package Size: 0603; JLCPCB Basic Part: No; JLCPCB Part Number: C393031; Supplier 1: LCSC; Category: Capacitors - MLCC; Supplier Part Number 1: C393031; Tolerance: ±20%; Voltage Rating: 6.3V; Temperature Coefficient: X6S; RoHS: Yes; ComponentLink1Description: Datasheet; ComponentLink1URL: https://wmsc.lcsc.com/wmsc/upload/file/pdf/v2/lcsc/1912111437_Murata-Electronics-GRM188C80J226ME15D_C393031.pdf; ComponentLink2Description: JLCPCB Part URL; ComponentLink2URL: https://jlcpcb.com/partdetail/C393031; ComponentLink3Description: LCSC Part URL; ComponentLink3URL: https://lcsc.com/product-detail/Multilayer-Ceramic-Capacitors-MLCC---SMD-SMT_Murata-Electronics-Murata-Electronics-GRM188C80J226ME15D_C393031.html
footprint CAP-0603 (0603 (1608M) Capacitor)
pins: 1, 2

## GRM188C80J475KE15D
designator C?  Capacitance: 4.7uF  (hidden comment: *)
Capacitor, Ceramic (MLCC), 4.7uF, ±10%, 6.3V, X6S, ±10%, SMD 0603; Manufacturer: Murata Electronics; Manufacturer Part Number: GRM188C80J475KE15D; Package Size: 0603; JLCPCB Basic Part: No; JLCPCB Part Number: C469534; Supplier 1: LCSC; Category: Capacitors - MLCC; Supplier Part Number 1: C469534; Tolerance: ±10%; Voltage Rating: 6.3V; Temperature Coefficient: X6S; RoHS: Yes; ComponentLink1Description: Datasheet; ComponentLink1URL: https://wmsc.lcsc.com/wmsc/upload/file/pdf/v2/lcsc/2304140030_Murata-Electronics-GRM188C80J475KE15D_C469534.pdf; ComponentLink2Description: JLCPCB Part URL; ComponentLink2URL: https://jlcpcb.com/partdetail/C469534; ComponentLink3Description: LCSC Part URL; ComponentLink3URL: https://lcsc.com/product-detail/Multilayer-Ceramic-Capacitors-MLCC---SMD-SMT_Murata-Electronics-Murata-Electronics-GRM188C80J475KE15D_C469534.html
footprint CAP-0603 (0603 (1608M) Capacitor)
pins: 1, 2

## GRM188C81A106KA73D
designator C?  Capacitance: 10uF  (hidden comment: *)
Capacitor, Ceramic (MLCC), 10uF, ±10%, 10V, X6S, ±10%, SMD 0603; Manufacturer: Murata Electronics; Manufacturer Part Number: GRM188C81A106KA73D; Package Size: 0603; JLCPCB Basic Part: No; JLCPCB Part Number: C385036; Supplier 1: LCSC; Category: Capacitors - MLCC; Supplier Part Number 1: C385036; Tolerance: ±10%; Voltage Rating: 10V; Temperature Coefficient: X6S; RoHS: Yes; ComponentLink1Description: Datasheet; ComponentLink1URL: https://wmsc.lcsc.com/wmsc/upload/file/pdf/v2/lcsc/2201242230_Murata-Electronics-GRM188C81A106KA73D_C385036.pdf; ComponentLink2Description: JLCPCB Part URL; ComponentLink2URL: https://jlcpcb.com/partdetail/C385036; ComponentLink3Description: LCSC Part URL; ComponentLink3URL: https://lcsc.com/product-detail/Multilayer-Ceramic-Capacitors-MLCC---SMD-SMT_Murata-Electronics-Murata-Electronics-GRM188C81A106KA73D_C385036.html
footprint CAP-0603 (0603 (1608M) Capacitor)
pins: 1, 2

## GRM188C81A106MA73D
designator C?  Capacitance: 10uF  (hidden comment: *)
Capacitor, Ceramic (MLCC), 10uF, ±20%, 10V, X6S, ±20%, SMD 0603; Manufacturer: Murata Electronics; Manufacturer Part Number: GRM188C81A106MA73D; Package Size: 0603; JLCPCB Basic Part: No; JLCPCB Part Number: C576470; Supplier 1: LCSC; Category: Capacitors - MLCC; Supplier Part Number 1: C576470; Tolerance: ±20%; Voltage Rating: 10V; Temperature Coefficient: X6S; RoHS: Yes; ComponentLink1Description: Datasheet; ComponentLink1URL: https://wmsc.lcsc.com/wmsc/upload/file/pdf/v2/lcsc/2304140030_Murata-Electronics-GRM188C81A106MA73D_C576470.pdf; ComponentLink2Description: JLCPCB Part URL; ComponentLink2URL: https://jlcpcb.com/partdetail/C576470; ComponentLink3Description: LCSC Part URL; ComponentLink3URL: https://lcsc.com/product-detail/Multilayer-Ceramic-Capacitors-MLCC---SMD-SMT_Murata-Electronics-Murata-Electronics-GRM188C81A106MA73D_C576470.html
footprint CAP-0603 (0603 (1608M) Capacitor)
pins: 1, 2

## GRM188C81C106MA73D
designator C?  Capacitance: 10uF  (hidden comment: *)
Capacitor, Ceramic (MLCC), 10uF, ±20%, 16V, X6S, ±20%, SMD 0603; Manufacturer: Murata Electronics; Manufacturer Part Number: GRM188C81C106MA73D; Package Size: 0603; JLCPCB Basic Part: No; JLCPCB Part Number: C182375; Supplier 1: LCSC; Category: Capacitors - MLCC; Supplier Part Number 1: C182375; Tolerance: ±20%; Voltage Rating: 16V; Temperature Coefficient: X6S; RoHS: Yes; ComponentLink1Description: Datasheet; ComponentLink1URL: https://wmsc.lcsc.com/wmsc/upload/file/pdf/v2/lcsc/2308111712_Murata-Electronics-GRM188C81C106MA73D_C182375.pdf; ComponentLink2Description: JLCPCB Part URL; ComponentLink2URL: https://jlcpcb.com/partdetail/C182375; ComponentLink3Description: LCSC Part URL; ComponentLink3URL: https://lcsc.com/product-detail/Multilayer-Ceramic-Capacitors-MLCC---SMD-SMT_Murata-Electronics-Murata-Electronics-GRM188C81C106MA73D_C182375.html
footprint CAP-0603 (0603 (1608M) Capacitor)
pins: 1, 2
